# Altium footprint library Connector.PcbLib: 536 footprints (part 33 of 34)
Each footprint in its own frame and in the unit in brackets; x right, y up, seen from the top. Pads: shape width x height; smd on the part's side, far side on the other; paste and mask are expansions set on the pad; w line width, h text height; cw(c..) or ccw(c..) is an arc to the next point about the centre after c.
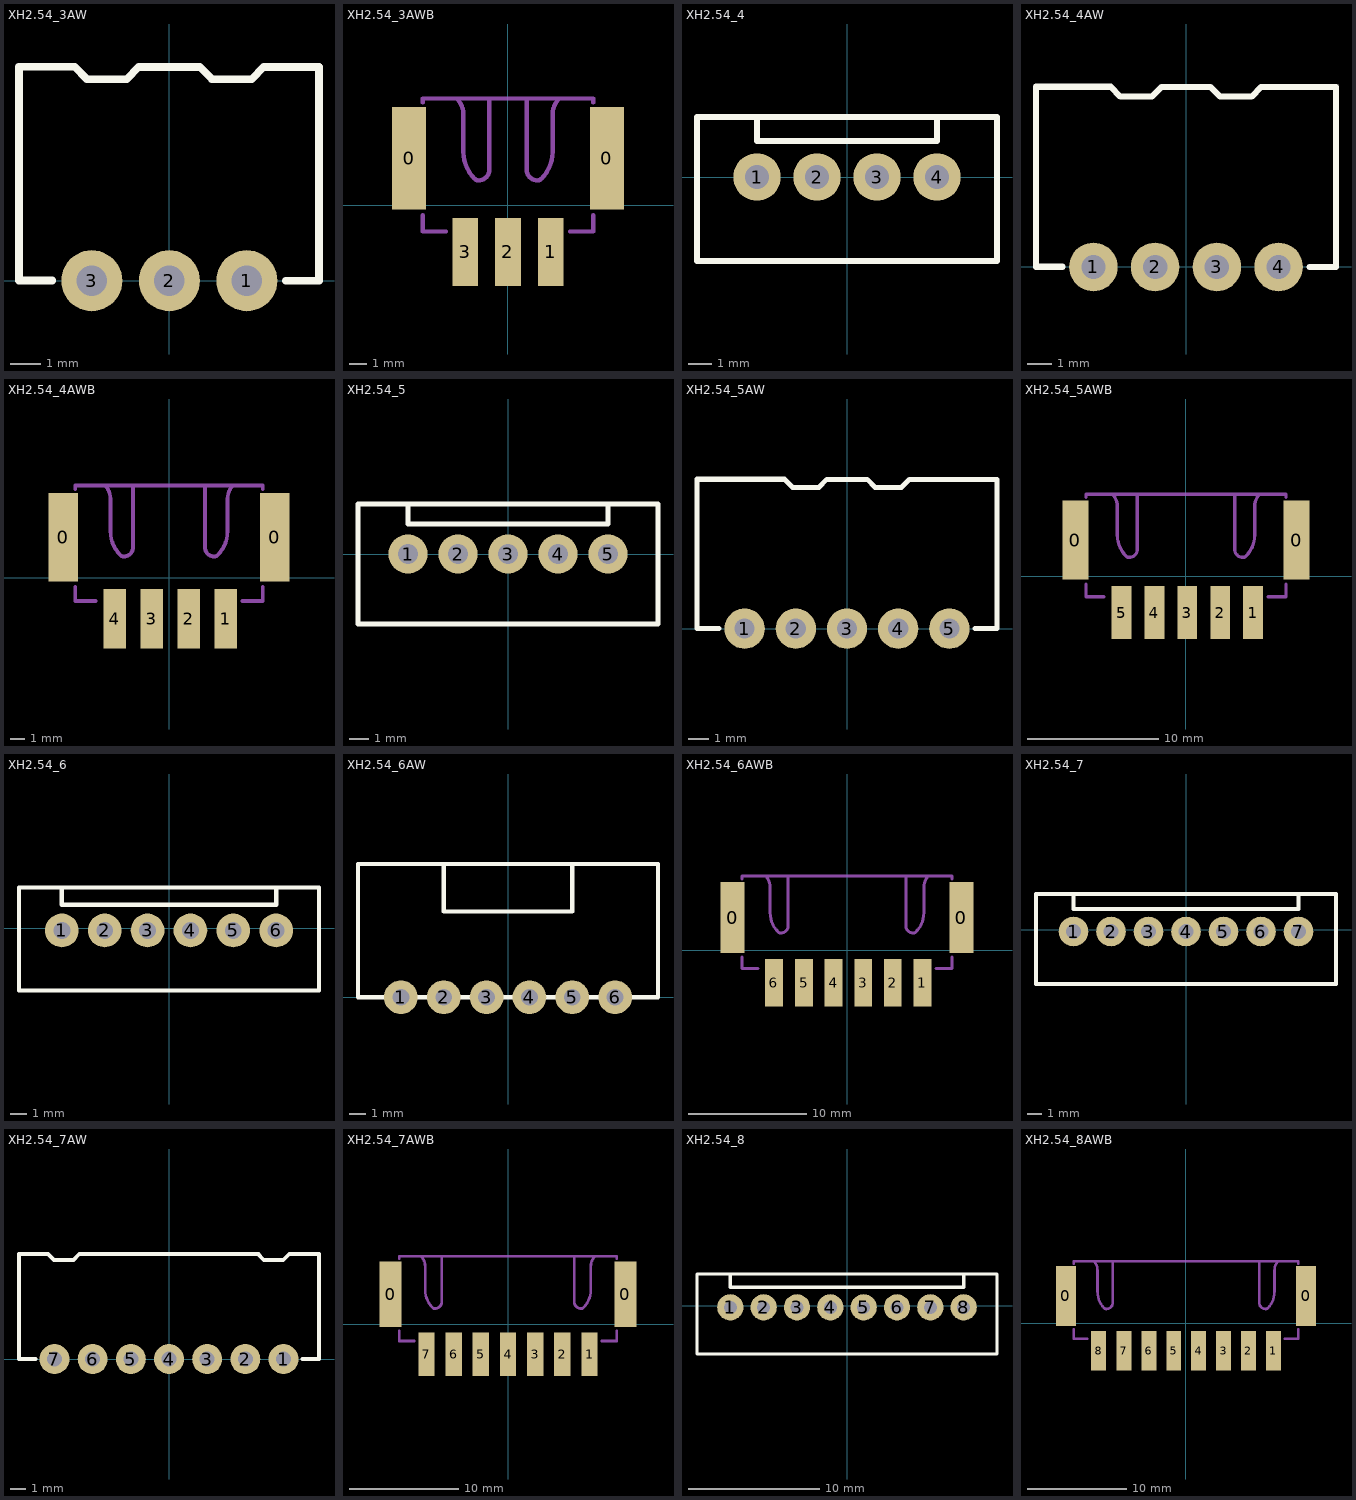
[diagram p32: the footprints below, top view; thin cyan lines are the x and y axes]

## XH2.54_3AW [mm]
pads (3):
  round 2 hole 1: 1(2.54,0) 2(0,0) 3(-2.54,0)
Top Overlay:
  lines w0.254: -4.925,7.007 -4.925,0.007 -3.832,0.007 ; -4.925,7.01 -3.102,7.01 -2.696,6.604 -1.4,6.604 -1,7.004 1,7.004 1.4,6.604 2.696,6.604 3.096,7.004 4.898,7.004 4.902,7 4.902,0 3.81,0
3D body "User Library-XH-A-3.STEP": height 6.1, standoff 0, extent -4.95,-3.269 4.95,7.131

## XH2.54_3AWB [mm]
pads (5):
  rect 2x6 smd: 0(-5.8,2.75) 0(5.8,2.75)
  rect 1.5x4 smd: 1(2.5,-2.75) 2(0,-2.75) 3(-2.5,-2.75)
Mechanical 15:
  lines w0.254: -5,-0.591 -5,-1.55 -3.636,-1.55 ; -5,6.013 -5,6.25 0,6.25 5,6.25 5,6.013 ; -3.001,6.25 cw(c-3.921,5.33) -2.62,5.33 -2.62,3.154 ccw(c-0.325,3.154) -1.948,1.531 ccw(c-1.731,1.748) -1.731,1.441 ccw(c-1.731,2.076) -1.096,2.076 -1.096,6.25 ; 1.096,6.25 1.096,2.076 ccw(c1.731,2.076) 1.731,1.441 ccw(c1.731,1.748) 1.948,1.531 ccw(c0.325,3.154) 2.62,3.154 2.62,5.33 cw(c3.921,5.33) 3.001,6.25 ; 3.636,-1.55 5,-1.55 5,-0.591

## XH2.54_4 [mm]
pads (4):
  round 2 hole 1: 1(-3.81,0) 2(-1.27,0) 3(1.27,0) 4(3.81,0)
Top Overlay:
  lines w0.254: -3.81,2.54 -3.81,1.524 3.81,1.524 3.81,2.54 ; -6.35,-3.556 -6.35,2.54 -5.842,2.54 6.35,2.54 6.35,-0.508 6.35,-3.556 -6.35,-3.556
3D body "User Library-XH-A-4.STEP": height 7.05, standoff -3.35, extent -6.198,-3.353 6.202,2.747

## XH2.54_4AW [mm]
pads (4):
  round 2 hole 1: 1(-3.81,0) 2(-1.27,0) 3(1.27,0) 4(3.81,0)
Top Overlay:
  lines w0.254: -6.172,7.41 -6.172,0.007 -5.08,0.007 ; -6.172,7.413 -3.096,7.413 ; -3.102,7.417 -2.696,7.01 -1.4,7.01 -1,7.41 1,7.41 1.4,7.01 2.696,7.01 3.096,7.41 6.172,7.41 6.172,0 5.08,0 ; 6.168,7.41 6.172,7.406
3D body "User Library-XH-A-4（弯）.STEP": height 6.1, standoff -3.35, extent -6.2,-0.282 6.2,7.518

## XH2.54_4AWB [mm]
pads (6):
  rect 2x6 smd: 0(-7.13,2.75) 0(7.13,2.75)
  rect 1.5x4 smd: 1(3.83,-2.75) 2(1.33,-2.75) 3(-1.17,-2.75) 4(-3.67,-2.75)
Mechanical 15:
  lines w0.254: -6.33,-0.591 -6.33,-1.55 -4.966,-1.55 ; -6.33,6.013 -6.33,6.25 0,6.25 6.33,6.25 6.33,6.013 ; -4.331,6.25 cw(c-5.251,5.33) -3.95,5.33 -3.95,3.154 ccw(c-1.655,3.154) -3.278,1.531 ccw(c-3.061,1.748) -3.061,1.441 ccw(c-3.061,2.076) -2.426,2.076 -2.426,6.25 ; 2.426,6.25 2.426,2.076 ccw(c3.061,2.076) 3.061,1.441 ccw(c3.061,1.748) 3.278,1.531 ccw(c1.655,3.154) 3.95,3.154 3.95,5.33 cw(c5.251,5.33) 4.331,6.25 ; 4.966,-1.55 6.33,-1.55 6.33,-0.591

## XH2.54_5 [mm]
pads (5):
  round 2 hole 1: 1(-5.08,0) 2(-2.54,0) 3(0,0) 4(2.54,0) 5(5.08,0)
Top Overlay:
  lines w0.254: 5.08,2.54 5.08,1.524 -2.54,1.524 -5.08,1.524 -5.08,2.54 ; -5.08,2.54 -4.572,2.54 7.62,2.54 7.62,-0.508 7.62,-3.556 -5.08,-3.556 -7.62,-3.556 -7.62,2.54 -5.08,2.54
3D body "User Library-XH-A-5.STEP": height 7.05, standoff -3.35, extent -7.442,-3.353 7.458,2.747

## XH2.54_5AW [mm]
pads (5):
  round 2 hole 1: 1(-5.08,0) 2(-2.54,0) 3(0,0) 4(2.54,0) 5(5.08,0)
Top Overlay:
  lines w0.254: -7.442,7.41 -7.442,0.007 -6.35,0.007 ; -7.442,7.413 -3.096,7.413 ; -3.102,7.417 -2.696,7.01 -1.4,7.01 -1,7.41 1,7.41 1.4,7.01 2.696,7.01 3.096,7.41 7.442,7.41 7.442,0 6.35,0 ; 6.168,7.41 6.172,7.406
3D body "User Library-XH-A-5.STEP": height 6.1, standoff 0, extent -7.45,-2.882 7.45,7.518

## XH2.54_5AWB [mm]
pads (7):
  rect 2x6 smd: 0(-8.4,2.75) 0(8.4,2.75)
  rect 1.5x4 smd: 1(5.1,-2.75) 2(2.6,-2.75) 3(0.1,-2.75) 4(-2.4,-2.75) 5(-4.9,-2.75)
Mechanical 15:
  lines w0.254: -7.599,-0.591 -7.599,-1.55 -6.235,-1.55 ; -7.599,6.013 -7.599,6.25 7.6,6.25 7.6,6.013 ; -5.6,6.25 cw(c-6.52,5.33) -5.219,5.33 -5.219,3.154 ccw(c-2.924,3.154) -4.547,1.531 ccw(c-4.33,1.748) -4.33,1.441 ccw(c-4.33,2.076) -3.695,2.076 -3.695,6.25 ; 3.696,6.25 3.696,2.076 ccw(c4.331,2.076) 4.331,1.441 ccw(c4.331,1.748) 4.548,1.531 ccw(c2.925,3.154) 5.22,3.154 5.22,5.33 cw(c6.521,5.33) 5.601,6.25 ; 6.236,-1.55 7.6,-1.55 7.6,-0.591

## XH2.54_6 [mm]
pads (6):
  round 2 hole 1: 1(-6.35,-0.127) 2(-3.81,-0.127) 3(-1.27,-0.127) 4(1.27,-0.127) 5(3.81,-0.127) 6(6.35,-0.127)
Top Overlay:
  lines w0.254: -6.35,2.413 -6.35,1.397 -1.27,1.397 6.35,1.397 6.35,2.413 ; -8.89,-3.683 -8.89,2.413 -3.81,2.413 -3.302,2.413 8.89,2.413 8.89,-0.635 8.89,-3.683 -3.81,-3.683 -8.89,-3.683
3D body "User Library-XH-A-6.STEP": height 7.05, standoff -3.35, extent -8.687,-3.454 8.713,2.646

## XH2.54_6AW [mm]
height 0.5
pads (6):
  round 2 hole 1: 1(-6.35,0) 2(-3.81,0) 3(-1.27,0) 4(1.27,0) 5(3.81,0) 6(6.35,0)
Top Overlay:
  lines w0.254: -3.861,7.9 -3.835,7.9 ; -3.81,7.9 -3.81,5.08 3.81,5.08 3.81,7.899 ; 2.896,7.899 2.946,7.899 ; -8.89,0 8.89,0 8.89,7.9 -8.89,7.9 -8.89,0
3D body "User Library-XH-A-6（弯）.STEP": height 6.1, standoff -2.35, extent -8.7,-0.025 8.7,7.675

## XH2.54_6AWB [mm]
pads (8):
  rect 2x6 smd: 0(-9.67,2.75) 0(9.67,2.75)
  rect 1.5x4 smd: 1(6.37,-2.75) 2(3.87,-2.75) 3(1.37,-2.75) 4(-1.13,-2.75) 5(-3.63,-2.75) 6(-6.17,-2.75)
Mechanical 15:
  lines w0.254: -8.87,-0.591 -8.87,-1.55 -7.506,-1.55 ; -8.87,6.013 -8.87,6.25 0,6.25 8.87,6.25 8.87,6.013 ; -6.871,6.25 cw(c-7.791,5.33) -6.49,5.33 -6.49,3.154 ccw(c-4.195,3.154) -5.818,1.531 ccw(c-5.601,1.748) -5.601,1.441 ccw(c-5.601,2.076) -4.966,2.076 -4.966,6.25 ; 4.966,6.25 4.966,2.076 ccw(c5.601,2.076) 5.601,1.441 ccw(c5.601,1.748) 5.818,1.531 ccw(c4.195,3.154) 6.49,3.154 6.49,5.33 cw(c7.791,5.33) 6.871,6.25 ; 7.506,-1.55 8.87,-1.55 8.87,-0.591

## XH2.54_7 [mm]
pads (7):
  round 2 hole 1: 1(-7.62,-0.127) 2(-5.08,-0.127) 3(-2.54,-0.127) 4(0,-0.127) 5(2.54,-0.127) 6(5.08,-0.127) 7(7.62,-0.127)
Top Overlay:
  lines w0.254: 7.62,2.413 7.62,1.397 0,1.397 -5.08,1.397 -7.62,1.397 -7.62,2.413 ; -7.62,2.413 -2.54,2.413 -2.032,2.413 10.16,2.413 10.16,-0.635 10.16,-3.683 -2.54,-3.683 -7.62,-3.683 -10.16,-3.683 -10.16,2.413 -7.62,2.413
3D body "User Library-XH-A-7.STEP": height 7.05, standoff -3.35, extent -9.95,-3.48 9.95,2.62

## XH2.54_7AW [mm]
pads (7):
  round 2 hole 1: 1(7.62,0) 2(5.08,0) 3(2.54,0) 4(0,0) 5(-2.54,0) 6(-5.08,0) 7(-7.62,0)
Top Overlay:
  lines w0.254: -9.982,7 -9.982,0 -8.89,0 ; -9.913,7.004 -8.858,7.004 -8.045,7.004 -7.645,6.604 -6.35,6.604 ; 5.924,6.985 6.305,6.604 7.601,6.604 8.001,7.004 9.978,7.004 9.982,7 9.982,0 8.89,0 ; 5.956,6.985 -5.969,6.985 ; -6.35,6.604 -5.969,6.985 ; -6.35,6.604 -5.969,6.985
3D body "User Library-XH-A-7.STEP": height 6.1, standoff 0, extent -9.956,-3.288 9.944,7.112

## XH2.54_7AWB [mm]
pads (9):
  rect 2x6 smd: 0(-10.8,2.75) 0(10.8,2.75)
  rect 1.5x4 smd: 1(7.5,-2.75) 2(5,-2.75) 3(2.5,-2.75) 4(0,-2.75) 5(-2.5,-2.75) 6(-5,-2.75) 7(-7.5,-2.75)
Mechanical 15:
  lines w0.254: -10,-0.591 -10,-1.55 -8.636,-1.55 ; -10,6.013 -10,6.25 10,6.25 10,6.013 ; -8.001,6.25 cw(c-8.921,5.33) -7.62,5.33 -7.62,3.154 ccw(c-5.325,3.154) -6.948,1.531 ccw(c-6.731,1.748) -6.731,1.441 ccw(c-6.731,2.076) -6.096,2.076 -6.096,6.25 ; 6.096,6.25 6.096,2.076 ccw(c6.731,2.076) 6.731,1.441 ccw(c6.731,1.748) 6.948,1.531 ccw(c5.325,3.154) 7.62,3.154 7.62,5.33 cw(c8.921,5.33) 8.001,6.25 ; 8.636,-1.55 10,-1.55 10,-0.591

## XH2.54_8 [mm]
pads (8):
  round 2 hole 1: 1(-8.89,-0.127) 2(-6.35,-0.127) 3(-3.81,-0.127) 4(-1.27,-0.127) 5(1.27,-0.127) 6(3.81,-0.127) 7(6.35,-0.127) 8(8.89,-0.127)
Top Overlay:
  lines w0.254: -8.89,2.413 -8.89,1.397 -3.81,1.397 1.27,1.397 8.89,1.397 8.89,2.413 ; -11.43,-3.683 -11.43,2.413 -6.35,2.413 -1.27,2.413 -0.762,2.413 11.43,2.413 11.43,-0.635 11.43,-3.683 -1.27,-3.683 -6.35,-3.683 -11.43,-3.683
3D body "User Library-XH-A-8.STEP": height 7.05, standoff -3.35, extent -11.2,-3.48 11.2,2.62

## XH2.54_8AWB [mm]
pads (10):
  rect 2x6 smd: 0(-12.07,2.75) 0(12.07,2.75)
  rect 1.5x4 smd: 1(8.77,-2.75) 2(6.27,-2.75) 3(3.77,-2.75) 4(1.27,-2.75) 5(-1.23,-2.75) 6(-3.73,-2.75) 7(-6.23,-2.75) 8(-8.77,-2.75)
Mechanical 15:
  lines w0.254: -11.27,-0.591 -11.27,-1.55 -9.906,-1.55 ; -11.27,6.013 -11.27,6.25 0,6.25 11.27,6.25 11.27,6.013 ; -9.271,6.25 cw(c-10.191,5.33) -8.89,5.33 -8.89,3.154 ccw(c-6.595,3.154) -8.218,1.531 ccw(c-8.001,1.748) -8.001,1.441 ccw(c-8.001,2.076) -7.366,2.076 -7.366,6.25 ; 7.366,6.25 7.366,2.076 ccw(c8.001,2.076) 8.001,1.441 ccw(c8.001,1.748) 8.218,1.531 ccw(c6.595,3.154) 8.89,3.154 8.89,5.33 cw(c10.191,5.33) 9.271,6.25 ; 9.906,-1.55 11.27,-1.55 11.27,-0.591